# Altium schematic symbol library Analog Devices Operational Amplifiers.SchLib: 2102 symbols (part 25 of 35) (continued)
## ADA4610-2ARMZ (continued)
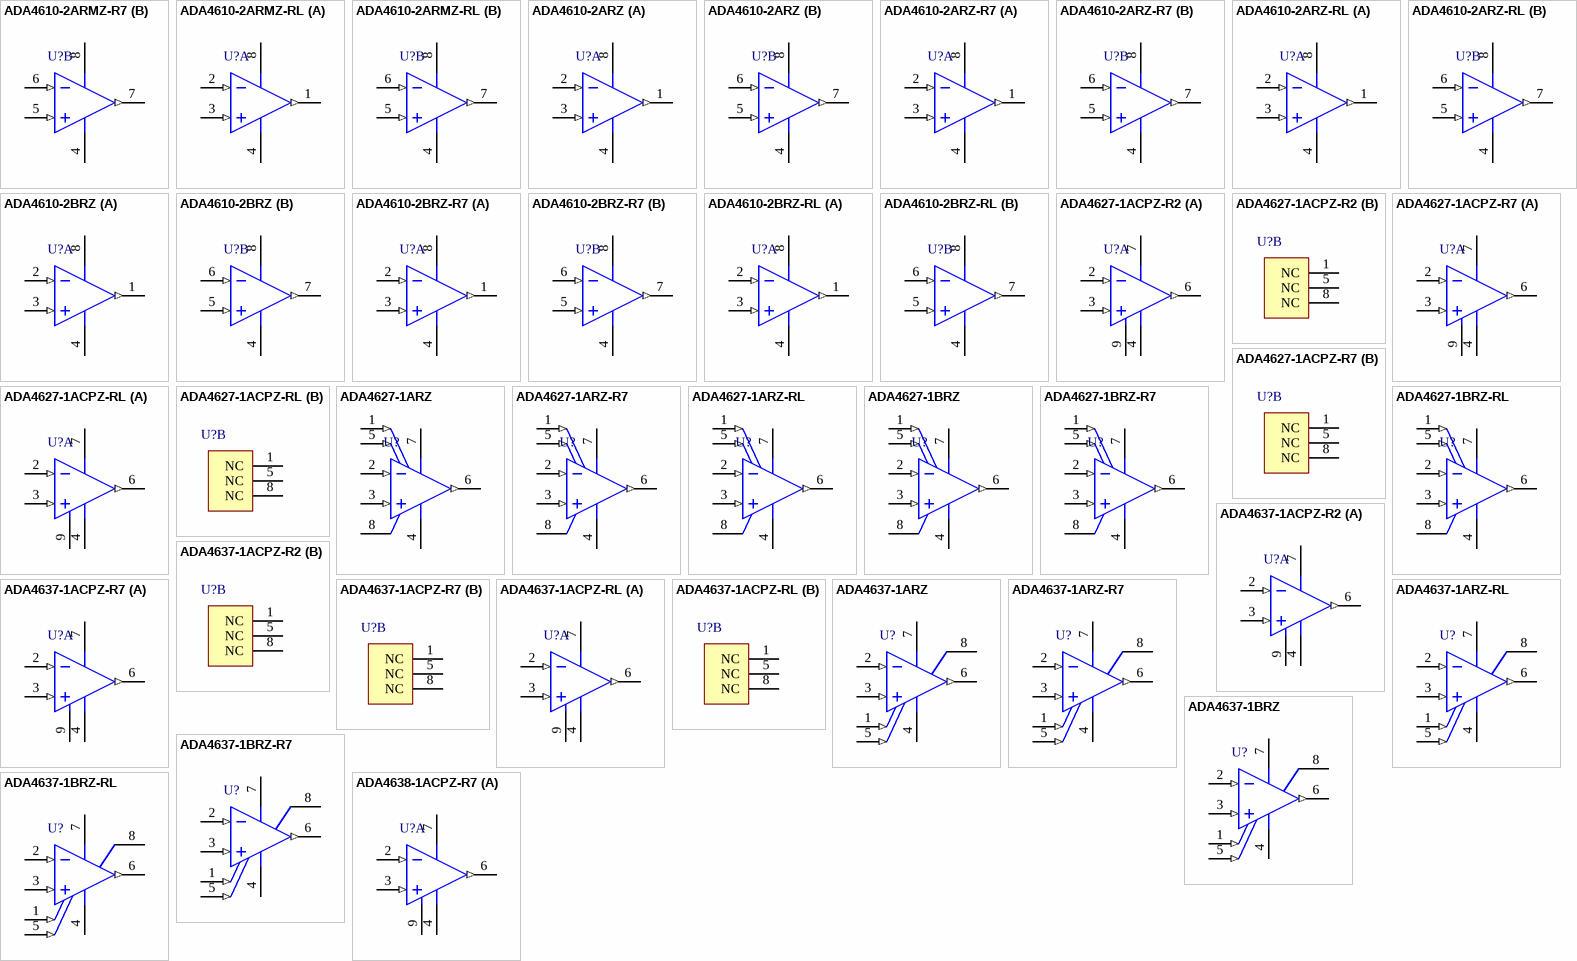
[diagram p80: symbols ADA4610-2ARMZ-R7 to ADA4638-1ACPZ-R7]

## ADA4610-2ARMZ-R7
designator U?
Double Channel Low Offset Voltage Drift Operational Amplifier, 10.6 MHz BW, 25 V/us SR, Industrial, 8-pin SOP (RM-8), Reel; Generic Part Number: ADA4610-2; Manufacturer: Analog Devices; PartNumber: ADA4610-2ARMZ-R7; Amplifiers Per Package: 2; Input Bias Current: 5pA; Input Offset Voltage: 400uV; Iq/Amp: 1.6mA; Slew Rate: 25V/us; V Span Max: 30V; V Span Min: 9V; DatasheetVersion: Rev. B; PackageReference: RM-8; PackageDescription: 8-Pin Mini Small Outline Package, Body 3 x 3 mm, Pitch 0.65 mm; Supplier 1: Digi-Key; Supplier Part Number 1: ADA4610-2ARMZ-R7-ND; Supplier 2: Newark; Supplier Part Number 2: 86T6048; Packing: Reel; Small Signal Bandwidth: 10.6MHz; Mounting Technology: Surface Mount; Code_JEDEC: MO-187-AA; ComponentLink1Description: Manufacturer URL; ComponentLink1URL: http://www.analog.com/en/index.html; ComponentLink2Description: Datasheet; ComponentLink2URL: http://www.analog.com/static/imported-files/data_sheets/ADA4610-2.pdf; ComponentLink3Description: Package Specification; ComponentLink3URL: http://www.analog.com/static/imported-files/packages/PKG_PDF/MSOP%28RM%29/RM_8.pdf
footprint ADI-RM-8_N (SOP, 8-Leads, Body 3x3mm, Pitch 0.65mm, IPC Medium Density)
footprint ADI-RM-8_L (SOP, 8-Leads, Body 3x3mm, Pitch 0.65mm, IPC High Density)
footprint ADI-RM-8_M (SOP, 8-Leads, Body 3x3mm, Pitch 0.65mm, IPC Low Density)
pins on every part: 4 -V (power), 8 +V (power)
part A pins: 1 OUT A (out), 2 -IN A (in), 3 +IN A (in)
part B pins: 5 +IN B (in), 6 -IN B (in), 7 OUT B (out)

## ADA4610-2ARMZ-RL
designator U?
Double Channel Low Offset Voltage Drift Operational Amplifier, 10.6 MHz BW, 25 V/us SR, Industrial, 8-pin SOP (RM-8), Reel; Generic Part Number: ADA4610-2; Manufacturer: Analog Devices; PartNumber: ADA4610-2ARMZ-RL; Amplifiers Per Package: 2; Input Bias Current: 5pA; Input Offset Voltage: 200uV; Iq/Amp: 1.6mA; Slew Rate: 25V/us; V Span Max: 30V; V Span Min: 9V; DatasheetVersion: Rev. B; PackageReference: RM-8; PackageDescription: 8-Pin Mini Small Outline Package, Body 3 x 3 mm, Pitch 0.65 mm; Supplier 1: Digi-Key; Supplier Part Number 1: ADA4610-2ARMZ-RL-ND; Supplier 2: Newark; Supplier Part Number 2: 86T6047; Packing: Reel; Small Signal Bandwidth: 10.6MHz; Mounting Technology: Surface Mount; Code_JEDEC: MO-187-AA; ComponentLink1Description: Manufacturer URL; ComponentLink1URL: http://www.analog.com/en/index.html; ComponentLink2Description: Datasheet; ComponentLink2URL: http://www.analog.com/static/imported-files/data_sheets/ADA4610-2.pdf; ComponentLink3Description: Package Specification; ComponentLink3URL: http://www.analog.com/static/imported-files/packages/PKG_PDF/MSOP%28RM%29/RM_8.pdf
footprint ADI-RM-8_N (SOP, 8-Leads, Body 3x3mm, Pitch 0.65mm, IPC Medium Density)
footprint ADI-RM-8_L (SOP, 8-Leads, Body 3x3mm, Pitch 0.65mm, IPC High Density)
footprint ADI-RM-8_M (SOP, 8-Leads, Body 3x3mm, Pitch 0.65mm, IPC Low Density)
pins on every part: 4 -V (power), 8 +V (power)
part A pins: 1 OUT A (out), 2 -IN A (in), 3 +IN A (in)
part B pins: 5 +IN B (in), 6 -IN B (in), 7 OUT B (out)

## ADA4610-2ARZ
designator U?
Double Channel Low Offset Voltage Drift Operational Amplifier, 10.6 MHz BW, 25 V/us SR, Industrial, 8-pin SOIC (R-8), Tube; Generic Part Number: ADA4610-2; Manufacturer: Analog Devices; PartNumber: ADA4610-2ARZ; Amplifiers Per Package: 2; Input Bias Current: 5pA; Input Offset Voltage: 200uV; Iq/Amp: 1.6mA; Slew Rate: 25V/us; V Span Max: 30V; V Span Min: 9V; DatasheetVersion: Rev. B; PackageVersion: 060506-A; PackageReference: R-8; PackageDescription: 8-Pin Standard Small Outline Package, Body 3.9 x 4.9 mm, Pitch 1.27 mm; Supplier 1: Digi-Key; Supplier Part Number 1: ADA4610-2ARZ-ND; Supplier 2: Farnell; Supplier Part Number 2: 2081046; Supplier 3: Farnell; Supplier Part Number 3: 2127819; Supplier 4: Newark; Supplier Part Number 4: 86T6049; Packing: Tube; Small Signal Bandwidth: 10.6MHz; Mounting Technology: Surface Mount; Code_JEDEC: MS-012-AA; ComponentLink1Description: Manufacturer URL; ComponentLink1URL: http://www.analog.com/en/index.html; ComponentLink2Description: Datasheet; ComponentLink2URL: http://www.analog.com/static/imported-files/data_sheets/ADA4610-2.pdf; ComponentLink3Description: Package Specification; ComponentLink3URL: http://www.analog.com/static/imported-files/packages/PKG_PDF/SOIC_Narrow%20(R)/R_8.pdf
footprint ADI-R-8_N (SOIC, 8-Leads, Body 4.9x3.9mm, Pitch 1.27mm, IPC Medium Density)
footprint ADI-R-8_L (SOIC, 8-Leads, Body 4.9x3.9mm, Pitch 1.27mm, IPC High Density)
footprint ADI-R-8_M (SOIC, 8-Leads, Body 4.9x3.9mm, Pitch 1.27mm, IPC Low Density)
pins on every part: 4 -V (power), 8 +V (power)
part A pins: 1 OUT A (out), 2 -IN A (in), 3 +IN A (in)
part B pins: 5 +IN B (in), 6 -IN B (in), 7 OUT B (out)

## ADA4610-2ARZ-R7
designator U?
Double Channel Low Offset Voltage Drift Operational Amplifier, 10.6 MHz BW, 25 V/us SR, Industrial, 8-pin SOIC (R-8), Reel; Generic Part Number: ADA4610-2; Manufacturer: Analog Devices; PartNumber: ADA4610-2ARZ-R7; Amplifiers Per Package: 2; Input Bias Current: 5pA; Input Offset Voltage: 200uV; Iq/Amp: 1.6mA; Slew Rate: 25V/us; V Span Max: 30V; V Span Min: 9V; DatasheetVersion: Rev. B; PackageVersion: 060506-A; PackageReference: R-8; PackageDescription: 8-Pin Standard Small Outline Package, Body 3.9 x 4.9 mm, Pitch 1.27 mm; Supplier 1: Digi-Key; Supplier Part Number 1: ADA4610-2ARZ-R7-ND; Supplier 2: Newark; Supplier Part Number 2: 86T6051; Packing: Reel; Small Signal Bandwidth: 10.6MHz; Mounting Technology: Surface Mount; Code_JEDEC: MS-012-AA; ComponentLink1Description: Manufacturer URL; ComponentLink1URL: http://www.analog.com/en/index.html; ComponentLink2Description: Datasheet; ComponentLink2URL: http://www.analog.com/static/imported-files/data_sheets/ADA4610-2.pdf; ComponentLink3Description: Package Specification; ComponentLink3URL: http://www.analog.com/static/imported-files/packages/PKG_PDF/SOIC_Narrow%20(R)/R_8.pdf
footprint ADI-R-8_N (SOIC, 8-Leads, Body 4.9x3.9mm, Pitch 1.27mm, IPC Medium Density)
footprint ADI-R-8_L (SOIC, 8-Leads, Body 4.9x3.9mm, Pitch 1.27mm, IPC High Density)
footprint ADI-R-8_M (SOIC, 8-Leads, Body 4.9x3.9mm, Pitch 1.27mm, IPC Low Density)
pins on every part: 4 -V (power), 8 +V (power)
part A pins: 1 OUT A (out), 2 -IN A (in), 3 +IN A (in)
part B pins: 5 +IN B (in), 6 -IN B (in), 7 OUT B (out)

## ADA4610-2ARZ-RL
designator U?
Double Channel Low Offset Voltage Drift Operational Amplifier, 10.6 MHz BW, 25 V/us SR, Industrial, 8-pin SOIC (R-8), Reel; Generic Part Number: ADA4610-2; Manufacturer: Analog Devices; PartNumber: ADA4610-2ARZ-RL; Amplifiers Per Package: 2; Input Bias Current: 5pA; Input Offset Voltage: 200uV; Iq/Amp: 1.6mA; Slew Rate: 25V/us; V Span Max: 30V; V Span Min: 9V; DatasheetVersion: Rev. B; PackageVersion: 060506-A; PackageReference: R-8; PackageDescription: 8-Pin Standard Small Outline Package, Body 3.9 x 4.9 mm, Pitch 1.27 mm; Supplier 1: Digi-Key; Supplier Part Number 1: ADA4610-2ARZ-RL-ND; Supplier 2: Newark; Supplier Part Number 2: 86T6050; Packing: Reel; Small Signal Bandwidth: 10.6MHz; Mounting Technology: Surface Mount; Code_JEDEC: MS-012-AA; ComponentLink1Description: Manufacturer URL; ComponentLink1URL: http://www.analog.com/en/index.html; ComponentLink2Description: Datasheet; ComponentLink2URL: http://www.analog.com/static/imported-files/data_sheets/ADA4610-2.pdf; ComponentLink3Description: Package Specification; ComponentLink3URL: http://www.analog.com/static/imported-files/packages/PKG_PDF/SOIC_Narrow%20(R)/R_8.pdf
footprint ADI-R-8_N (SOIC, 8-Leads, Body 4.9x3.9mm, Pitch 1.27mm, IPC Medium Density)
footprint ADI-R-8_L (SOIC, 8-Leads, Body 4.9x3.9mm, Pitch 1.27mm, IPC High Density)
footprint ADI-R-8_M (SOIC, 8-Leads, Body 4.9x3.9mm, Pitch 1.27mm, IPC Low Density)
pins on every part: 4 -V (power), 8 +V (power)
part A pins: 1 OUT A (out), 2 -IN A (in), 3 +IN A (in)
part B pins: 5 +IN B (in), 6 -IN B (in), 7 OUT B (out)

## ADA4610-2BRZ
designator U?
Double Channel Low Offset Voltage Drift Operational Amplifier, 10.6 MHz BW, 25 V/us SR, Industrial, 8-pin SOIC (R-8), Tube; Generic Part Number: ADA4610-2; Manufacturer: Analog Devices; PartNumber: ADA4610-2BRZ; Amplifiers Per Package: 2; Input Bias Current: 5pA; Input Offset Voltage: 200uV; Iq/Amp: 1.6mA; Slew Rate: 25V/us; V Span Max: 30V; V Span Min: 9V; DatasheetVersion: Rev. B; PackageVersion: 060506-A; PackageReference: R-8; PackageDescription: 8-Pin Standard Small Outline Package, Body 3.9 x 4.9 mm, Pitch 1.27 mm; Supplier 1: Digi-Key; Supplier Part Number 1: ADA4610-2BRZ-ND; Supplier 2: Farnell; Supplier Part Number 2: 2081047; Supplier 3: Newark; Supplier Part Number 3: 86T6052; Packing: Tube; Small Signal Bandwidth: 10.6MHz; Mounting Technology: Surface Mount; Code_JEDEC: MS-012-AA; ComponentLink1Description: Manufacturer URL; ComponentLink1URL: http://www.analog.com/en/index.html; ComponentLink2Description: Datasheet; ComponentLink2URL: http://www.analog.com/static/imported-files/data_sheets/ADA4610-2.pdf; ComponentLink3Description: Package Specification; ComponentLink3URL: http://www.analog.com/static/imported-files/packages/PKG_PDF/SOIC_Narrow%20(R)/R_8.pdf
footprint ADI-R-8_N (SOIC, 8-Leads, Body 4.9x3.9mm, Pitch 1.27mm, IPC Medium Density)
footprint ADI-R-8_L (SOIC, 8-Leads, Body 4.9x3.9mm, Pitch 1.27mm, IPC High Density)
footprint ADI-R-8_M (SOIC, 8-Leads, Body 4.9x3.9mm, Pitch 1.27mm, IPC Low Density)
pins on every part: 4 -V (power), 8 +V (power)
part A pins: 1 OUT A (out), 2 -IN A (in), 3 +IN A (in)
part B pins: 5 +IN B (in), 6 -IN B (in), 7 OUT B (out)

## ADA4610-2BRZ-R7
designator U?
Double Channel Low Offset Voltage Drift Operational Amplifier, 10.6 MHz BW, 25 V/us SR, Industrial, 8-pin SOIC (R-8), Reel; Generic Part Number: ADA4610-2; Manufacturer: Analog Devices; PartNumber: ADA4610-2BRZ-R7; Amplifiers Per Package: 2; Input Bias Current: 5pA; Input Offset Voltage: 200uV; Iq/Amp: 1.6mA; Slew Rate: 25V/us; V Span Max: 30V; V Span Min: 9V; DatasheetVersion: Rev. B; PackageVersion: 060506-A; PackageReference: R-8; PackageDescription: 8-Pin Standard Small Outline Package, Body 3.9 x 4.9 mm, Pitch 1.27 mm; Supplier 1: Digi-Key; Supplier Part Number 1: ADA4610-2BRZ-R7-ND; Supplier 2: Newark; Supplier Part Number 2: 86T6054; Packing: Reel; Small Signal Bandwidth: 10.6MHz; Mounting Technology: Surface Mount; Code_JEDEC: MS-012-AA; ComponentLink1Description: Manufacturer URL; ComponentLink1URL: http://www.analog.com/en/index.html; ComponentLink2Description: Datasheet; ComponentLink2URL: http://www.analog.com/static/imported-files/data_sheets/ADA4610-2.pdf; ComponentLink3Description: Package Specification; ComponentLink3URL: http://www.analog.com/static/imported-files/packages/PKG_PDF/SOIC_Narrow%20(R)/R_8.pdf
footprint ADI-R-8_N (SOIC, 8-Leads, Body 4.9x3.9mm, Pitch 1.27mm, IPC Medium Density)
footprint ADI-R-8_L (SOIC, 8-Leads, Body 4.9x3.9mm, Pitch 1.27mm, IPC High Density)
footprint ADI-R-8_M (SOIC, 8-Leads, Body 4.9x3.9mm, Pitch 1.27mm, IPC Low Density)
pins on every part: 4 -V (power), 8 +V (power)
part A pins: 1 OUT A (out), 2 -IN A (in), 3 +IN A (in)
part B pins: 5 +IN B (in), 6 -IN B (in), 7 OUT B (out)

## ADA4610-2BRZ-RL
designator U?
Double Channel Low Offset Voltage Drift Operational Amplifier, 10.6 MHz BW, 25 V/us SR, Industrial, 8-pin SOIC (R-8), Reel; Generic Part Number: ADA4610-2; Manufacturer: Analog Devices; PartNumber: ADA4610-2BRZ-RL; Amplifiers Per Package: 2; Input Bias Current: 5pA; Input Offset Voltage: 200uV; Iq/Amp: 1.6mA; Slew Rate: 25V/us; V Span Max: 30V; V Span Min: 9V; DatasheetVersion: Rev. B; PackageVersion: 060506-A; PackageReference: R-8; PackageDescription: 8-Pin Standard Small Outline Package, Body 3.9 x 4.9 mm, Pitch 1.27 mm; Supplier 1: Digi-Key; Supplier Part Number 1: ADA4610-2BRZ-RL-ND; Supplier 2: Newark; Supplier Part Number 2: 86T6053; Packing: Reel; Small Signal Bandwidth: 10.6MHz; Mounting Technology: Surface Mount; Code_JEDEC: MS-012-AA; ComponentLink1Description: Manufacturer URL; ComponentLink1URL: http://www.analog.com/en/index.html; ComponentLink2Description: Datasheet; ComponentLink2URL: http://www.analog.com/static/imported-files/data_sheets/ADA4610-2.pdf; ComponentLink3Description: Package Specification; ComponentLink3URL: http://www.analog.com/static/imported-files/packages/PKG_PDF/SOIC_Narrow%20(R)/R_8.pdf
footprint ADI-R-8_N (SOIC, 8-Leads, Body 4.9x3.9mm, Pitch 1.27mm, IPC Medium Density)
footprint ADI-R-8_L (SOIC, 8-Leads, Body 4.9x3.9mm, Pitch 1.27mm, IPC High Density)
footprint ADI-R-8_M (SOIC, 8-Leads, Body 4.9x3.9mm, Pitch 1.27mm, IPC Low Density)
pins on every part: 4 -V (power), 8 +V (power)
part A pins: 1 OUT A (out), 2 -IN A (in), 3 +IN A (in)
part B pins: 5 +IN B (in), 6 -IN B (in), 7 OUT B (out)

## ADA4627-1ACPZ-R2
designator U?
Single Channel Low Offset Voltage Operational Amplifier, 19 MHz BW, 40 V/us SR, Industrial, 8-pin QFN (CP-8-2), Reel; Generic Part Number: ADA4627-1; Manufacturer: Analog Devices; PartNumber: ADA4627-1ACPZ-R2; Amplifiers Per Package: 1; Input Bias Current: 1pA; Input Offset Voltage: 70uV; Iq/Amp: 7mA; Slew Rate: 40V/us; Small Signal Bandwidth: 19MHz; V Span Max: 30V; V Span Min: 10V; DatasheetVersion: Rev. D; PackageVersion: 061507-B; PackageReference: CP-8-2; PackageDescription: 8-Pin Lead Frame Chip Scale Package, Body 3 x 3 mm, Pitch 0.5 mm; Supplier 1: Digi-Key; Supplier Part Number 1: ADA4627-1ACPZ-R2TR-ND; Supplier 2: Digi-Key; Supplier Part Number 2: ADA4627-1ACPZ-R2CT-ND; Supplier 3: Digi-Key; Supplier Part Number 3: ADA4627-1ACPZ-R2DKR-ND; Supplier 4: Farnell; Supplier Part Number 4: 1827379; Supplier 5: Newark; Supplier Part Number 5: 26R2396; Mounting Technology: Surface Mount; ComponentLink1Description: Manufacturer URL; ComponentLink1URL: http://www.analog.com/en/index.html; ComponentLink2Description: Datasheet; ComponentLink2URL: http://www.analog.com/static/imported-files/data_sheets/ADA4627-1_4637-1.pdf; ComponentLink3Description: Package Specification; ComponentLink3URL: http://www.analog.com/static/imported-files/packages/56953322593982CP_8_2.pdf; ComponentLink4Description: Reference Circuit; ComponentLink4URL: http://www.analog.com/en/all-operational-amplifiers-op-amps/operational-amplifiers-op-amps/ada4627-1/products/product.html#product-recommendations
footprint ADI-CP-8-2_N (QFN, 8-Leads, Body 3x3mm, Pitch 0.5mm, Thermal Pad 1.45X1.74mm, IPC Medium Density)
footprint ADI-CP-8-2_L (QFN, 8-Leads, Body 3x3mm, Pitch 0.5mm, Thermal Pad 1.45X1.74mm, IPC High Density)
footprint ADI-CP-8-2_M (QFN, 8-Leads, Body 3x3mm, Pitch 0.5mm, Thermal Pad 1.45X1.74mm, IPC Low Density)
part A pins: 2 -IN (in), 3 +IN (in), 4 -V (power), 6 OUT (out), 7 +V (power), 9 EP (power)
part B pins: 1 NC, 5 NC, 8 NC

## ADA4627-1ACPZ-R7
designator U?
Single Channel Low Offset Voltage Operational Amplifier, 19 MHz BW, 40 V/us SR, Industrial, 8-pin QFN (CP-8-2), Reel; Generic Part Number: ADA4627-1; Manufacturer: Analog Devices; PartNumber: ADA4627-1ACPZ-R7; Amplifiers Per Package: 1; Input Bias Current: 1pA; Input Offset Voltage: 70uV; Iq/Amp: 7mA; Slew Rate: 40V/us; Small Signal Bandwidth: 19MHz; V Span Max: 30V; V Span Min: 10V; DatasheetVersion: Rev. D; PackageVersion: 061507-B; PackageReference: CP-8-2; PackageDescription: 8-Pin Lead Frame Chip Scale Package, Body 3 x 3 mm, Pitch 0.5 mm; Supplier 1: Digi-Key; Supplier Part Number 1: ADA4627-1ACPZ-R7-ND; Supplier 2: Newark; Supplier Part Number 2: 26R2397; Mounting Technology: Surface Mount; ComponentLink1Description: Manufacturer URL; ComponentLink1URL: http://www.analog.com/en/index.html; ComponentLink2Description: Datasheet; ComponentLink2URL: http://www.analog.com/static/imported-files/data_sheets/ADA4627-1_4637-1.pdf; ComponentLink3Description: Package Specification; ComponentLink3URL: http://www.analog.com/static/imported-files/packages/56953322593982CP_8_2.pdf; ComponentLink4Description: Reference Circuit; ComponentLink4URL: http://www.analog.com/en/all-operational-amplifiers-op-amps/operational-amplifiers-op-amps/ada4627-1/products/product.html#product-recommendations
footprint ADI-CP-8-2_N (QFN, 8-Leads, Body 3x3mm, Pitch 0.5mm, Thermal Pad 1.45X1.74mm, IPC Medium Density)
footprint ADI-CP-8-2_L (QFN, 8-Leads, Body 3x3mm, Pitch 0.5mm, Thermal Pad 1.45X1.74mm, IPC High Density)
footprint ADI-CP-8-2_M (QFN, 8-Leads, Body 3x3mm, Pitch 0.5mm, Thermal Pad 1.45X1.74mm, IPC Low Density)
part A pins: 2 -IN (in), 3 +IN (in), 4 -V (power), 6 OUT (out), 7 +V (power), 9 EP (power)
part B pins: 1 NC, 5 NC, 8 NC

## ADA4627-1ACPZ-RL
designator U?
Single Channel Low Offset Voltage Operational Amplifier, 19 MHz BW, 40 V/us SR, Industrial, 8-pin QFN (CP-8-2), Reel; Generic Part Number: ADA4627-1; Manufacturer: Analog Devices; PartNumber: ADA4627-1ACPZ-RL; Amplifiers Per Package: 1; Input Bias Current: 1pA; Input Offset Voltage: 70uV; Iq/Amp: 7mA; Slew Rate: 40V/us; Small Signal Bandwidth: 19MHz; V Span Max: 30V; V Span Min: 10V; DatasheetVersion: Rev. D; PackageVersion: 061507-B; PackageReference: CP-8-2; PackageDescription: 8-Pin Lead Frame Chip Scale Package, Body 3 x 3 mm, Pitch 0.5 mm; Supplier 1: Digi-Key; Supplier Part Number 1: ADA4627-1ACPZ-RL-ND; Mounting Technology: Surface Mount; ComponentLink1Description: Manufacturer URL; ComponentLink1URL: http://www.analog.com/en/index.html; ComponentLink2Description: Datasheet; ComponentLink2URL: http://www.analog.com/static/imported-files/data_sheets/ADA4627-1_4637-1.pdf; ComponentLink3Description: Package Specification; ComponentLink3URL: http://www.analog.com/static/imported-files/packages/56953322593982CP_8_2.pdf; ComponentLink4Description: Reference Circuit; ComponentLink4URL: http://www.analog.com/en/all-operational-amplifiers-op-amps/operational-amplifiers-op-amps/ada4627-1/products/product.html#product-recommendations
footprint ADI-CP-8-2_N (QFN, 8-Leads, Body 3x3mm, Pitch 0.5mm, Thermal Pad 1.45X1.74mm, IPC Medium Density)
footprint ADI-CP-8-2_L (QFN, 8-Leads, Body 3x3mm, Pitch 0.5mm, Thermal Pad 1.45X1.74mm, IPC High Density)
footprint ADI-CP-8-2_M (QFN, 8-Leads, Body 3x3mm, Pitch 0.5mm, Thermal Pad 1.45X1.74mm, IPC Low Density)
part A pins: 2 -IN (in), 3 +IN (in), 4 -V (power), 6 OUT (out), 7 +V (power), 9 EP (power)
part B pins: 1 NC, 5 NC, 8 NC

## ADA4627-1ARZ
designator U?
Single Channel Low Offset Voltage Operational Amplifier, 19 MHz BW, 40 V/us SR, Industrial, 8-pin SOIC (R-8), Tube; Generic Part Number: ADA4627-1; Manufacturer: Analog Devices; PartNumber: ADA4627-1ARZ; Amplifiers Per Package: 1; Input Bias Current: 1pA; Input Offset Voltage: 70uV; Iq/Amp: 7mA; Slew Rate: 40V/us; Small Signal Bandwidth: 19MHz; V Span Max: 30V; V Span Min: 10V; DatasheetVersion: Rev. D; PackageVersion: 060506-A; PackageReference: R-8; PackageDescription: 8-Pin Standard Small Outline Package, Body 3.9 x 4.9 mm, Pitch 1.27 mm; Supplier 1: Digi-Key; Supplier Part Number 1: ADA4627-1ARZ-ND; Supplier 2: Farnell; Supplier Part Number 2: 1827378; Supplier 3: Newark; Supplier Part Number 3: 26R2398; Mounting Technology: Surface Mount; Code_JEDEC: MS-012-AA; ComponentLink1Description: Manufacturer URL; ComponentLink1URL: http://www.analog.com/en/index.html; ComponentLink2Description: Datasheet; ComponentLink2URL: http://www.analog.com/static/imported-files/data_sheets/ADA4627-1_4637-1.pdf; ComponentLink3Description: Package Specification; ComponentLink3URL: http://www.analog.com/static/imported-files/packages/PKG_PDF/SOIC_Narrow%20(R)/R_8.pdf; ComponentLink4Description: Reference Circuit; ComponentLink4URL: http://www.analog.com/en/all-operational-amplifiers-op-amps/operational-amplifiers-op-amps/ada4627-1/products/product.html#product-recommendations
footprint ADI-R-8_N (SOIC, 8-Leads, Body 4.9x3.9mm, Pitch 1.27mm, IPC Medium Density)
footprint ADI-R-8_L (SOIC, 8-Leads, Body 4.9x3.9mm, Pitch 1.27mm, IPC High Density)
footprint ADI-R-8_M (SOIC, 8-Leads, Body 4.9x3.9mm, Pitch 1.27mm, IPC Low Density)
pins: 1 NULL (in), 2 -IN (in), 3 +IN (in), 4 -V (power), 5 NULL (in), 6 OUT (out), 7 +V (power), 8 NC

## ADA4627-1ARZ-R7
designator U?
Single Channel Low Offset Voltage Operational Amplifier, 19 MHz BW, 40 V/us SR, Industrial, 8-pin SOIC (R-8), Reel; Generic Part Number: ADA4627-1; Manufacturer: Analog Devices; PartNumber: ADA4627-1ARZ-R7; Amplifiers Per Package: 1; Input Bias Current: 1pA; Input Offset Voltage: 70uV; Iq/Amp: 7mA; Slew Rate: 40V/us; Small Signal Bandwidth: 19MHz; V Span Max: 30V; V Span Min: 10V; DatasheetVersion: Rev. D; PackageVersion: 060506-A; PackageReference: R-8; PackageDescription: 8-Pin Standard Small Outline Package, Body 3.9 x 4.9 mm, Pitch 1.27 mm; Supplier 1: Digi-Key; Supplier Part Number 1: ADA4627-1ARZ-R7TR-ND; Supplier 2: Digi-Key; Supplier Part Number 2: ADA4627-1ARZ-R7CT-ND; Supplier 3: Digi-Key; Supplier Part Number 3: ADA4627-1ARZ-R7DKR-ND; Supplier 4: Newark; Supplier Part Number 4: 26R2400; Mounting Technology: Surface Mount; Code_JEDEC: MS-012-AA; ComponentLink1Description: Manufacturer URL; ComponentLink1URL: http://www.analog.com/en/index.html; ComponentLink2Description: Datasheet; ComponentLink2URL: http://www.analog.com/static/imported-files/data_sheets/ADA4627-1_4637-1.pdf; ComponentLink3Description: Package Specification; ComponentLink3URL: http://www.analog.com/static/imported-files/packages/PKG_PDF/SOIC_Narrow%20(R)/R_8.pdf; ComponentLink4Description: Reference Circuit; ComponentLink4URL: http://www.analog.com/en/all-operational-amplifiers-op-amps/operational-amplifiers-op-amps/ada4627-1/products/product.html#product-recommendations
footprint ADI-R-8_N (SOIC, 8-Leads, Body 4.9x3.9mm, Pitch 1.27mm, IPC Medium Density)
footprint ADI-R-8_L (SOIC, 8-Leads, Body 4.9x3.9mm, Pitch 1.27mm, IPC High Density)
footprint ADI-R-8_M (SOIC, 8-Leads, Body 4.9x3.9mm, Pitch 1.27mm, IPC Low Density)
pins: 1 NULL (in), 2 -IN (in), 3 +IN (in), 4 -V (power), 5 NULL (in), 6 OUT (out), 7 +V (power), 8 NC

## ADA4627-1ARZ-RL
designator U?
Single Channel Low Offset Voltage Operational Amplifier, 19 MHz BW, 40 V/us SR, Industrial, 8-pin SOIC (R-8), Reel; Generic Part Number: ADA4627-1; Manufacturer: Analog Devices; PartNumber: ADA4627-1ARZ-RL; Amplifiers Per Package: 1; Input Bias Current: 1pA; Input Offset Voltage: 70uV; Iq/Amp: 7mA; Slew Rate: 40V/us; Small Signal Bandwidth: 19MHz; V Span Max: 30V; V Span Min: 10V; DatasheetVersion: Rev. D; PackageVersion: 060506-A; PackageReference: R-8; PackageDescription: 8-Pin Standard Small Outline Package, Body 3.9 x 4.9 mm, Pitch 1.27 mm; Supplier 1: Digi-Key; Supplier Part Number 1: ADA4627-1ARZ-RL-ND; Supplier 2: Newark; Supplier Part Number 2: 26R2399; Mounting Technology: Surface Mount; Code_JEDEC: MS-012-AA; ComponentLink1Description: Manufacturer URL; ComponentLink1URL: http://www.analog.com/en/index.html; ComponentLink2Description: Datasheet; ComponentLink2URL: http://www.analog.com/static/imported-files/data_sheets/ADA4627-1_4637-1.pdf; ComponentLink3Description: Package Specification; ComponentLink3URL: http://www.analog.com/static/imported-files/packages/PKG_PDF/SOIC_Narrow%20(R)/R_8.pdf; ComponentLink4Description: Reference Circuit; ComponentLink4URL: http://www.analog.com/en/all-operational-amplifiers-op-amps/operational-amplifiers-op-amps/ada4627-1/products/product.html#product-recommendations
footprint ADI-R-8_N (SOIC, 8-Leads, Body 4.9x3.9mm, Pitch 1.27mm, IPC Medium Density)
footprint ADI-R-8_L (SOIC, 8-Leads, Body 4.9x3.9mm, Pitch 1.27mm, IPC High Density)
footprint ADI-R-8_M (SOIC, 8-Leads, Body 4.9x3.9mm, Pitch 1.27mm, IPC Low Density)
pins: 1 NULL (in), 2 -IN (in), 3 +IN (in), 4 -V (power), 5 NULL (in), 6 OUT (out), 7 +V (power), 8 NC

## ADA4627-1BRZ
designator U?
Single Channel Low Offset Voltage Operational Amplifier, 19 MHz BW, 40 V/us SR, Industrial, 8-pin SOIC (R-8), Tube; Generic Part Number: ADA4627-1; Manufacturer: Analog Devices; PartNumber: ADA4627-1BRZ; Amplifiers Per Package: 1; Input Bias Current: 1pA; Input Offset Voltage: 70uV; Iq/Amp: 7mA; Slew Rate: 40V/us; Small Signal Bandwidth: 19MHz; V Span Max: 30V; V Span Min: 10V; DatasheetVersion: Rev. D; PackageVersion: 060506-A; PackageReference: R-8; PackageDescription: 8-Pin Standard Small Outline Package, Body 3.9 x 4.9 mm, Pitch 1.27 mm; Supplier 1: Digi-Key; Supplier Part Number 1: ADA4627-1BRZ-ND; Supplier 2: Farnell; Supplier Part Number 2: 2067785; Supplier 3: Newark; Supplier Part Number 3: 73T8137; Supplier 4: Newark; Supplier Part Number 4: 26R2401; Mounting Technology: Surface Mount; Code_JEDEC: MS-012-AA; ComponentLink1Description: Manufacturer URL; ComponentLink1URL: http://www.analog.com/en/index.html; ComponentLink2Description: Datasheet; ComponentLink2URL: http://www.analog.com/static/imported-files/data_sheets/ADA4627-1_4637-1.pdf; ComponentLink3Description: Package Specification; ComponentLink3URL: http://www.analog.com/static/imported-files/packages/PKG_PDF/SOIC_Narrow%20(R)/R_8.pdf; ComponentLink4Description: Reference Circuit; ComponentLink4URL: http://www.analog.com/en/all-operational-amplifiers-op-amps/operational-amplifiers-op-amps/ada4627-1/products/product.html#product-recommendations
footprint ADI-R-8_N (SOIC, 8-Leads, Body 4.9x3.9mm, Pitch 1.27mm, IPC Medium Density)
footprint ADI-R-8_L (SOIC, 8-Leads, Body 4.9x3.9mm, Pitch 1.27mm, IPC High Density)
footprint ADI-R-8_M (SOIC, 8-Leads, Body 4.9x3.9mm, Pitch 1.27mm, IPC Low Density)
pins: 1 NULL (in), 2 -IN (in), 3 +IN (in), 4 -V (power), 5 NULL (in), 6 OUT (out), 7 +V (power), 8 NC

## ADA4627-1BRZ-R7
designator U?
Single Channel Low Offset Voltage Operational Amplifier, 19 MHz BW, 40 V/us SR, Industrial, 8-pin SOIC (R-8), Reel; Generic Part Number: ADA4627-1; Manufacturer: Analog Devices; PartNumber: ADA4627-1BRZ-R7; Amplifiers Per Package: 1; Input Bias Current: 1pA; Input Offset Voltage: 70uV; Iq/Amp: 7mA; Slew Rate: 40V/us; Small Signal Bandwidth: 19MHz; V Span Max: 30V; V Span Min: 10V; DatasheetVersion: Rev. D; PackageVersion: 060506-A; PackageReference: R-8; PackageDescription: 8-Pin Standard Small Outline Package, Body 3.9 x 4.9 mm, Pitch 1.27 mm; Supplier 1: Digi-Key; Supplier Part Number 1: ADA4627-1BRZ-R7-ND; Supplier 2: Newark; Supplier Part Number 2: 26R2403; Mounting Technology: Surface Mount; Code_JEDEC: MS-012-AA; ComponentLink1Description: Manufacturer URL; ComponentLink1URL: http://www.analog.com/en/index.html; ComponentLink2Description: Datasheet; ComponentLink2URL: http://www.analog.com/static/imported-files/data_sheets/ADA4627-1_4637-1.pdf; ComponentLink3Description: Package Specification; ComponentLink3URL: http://www.analog.com/static/imported-files/packages/PKG_PDF/SOIC_Narrow%20(R)/R_8.pdf; ComponentLink4Description: Reference Circuit; ComponentLink4URL: http://www.analog.com/en/all-operational-amplifiers-op-amps/operational-amplifiers-op-amps/ada4627-1/products/product.html#product-recommendations
footprint ADI-R-8_N (SOIC, 8-Leads, Body 4.9x3.9mm, Pitch 1.27mm, IPC Medium Density)
footprint ADI-R-8_L (SOIC, 8-Leads, Body 4.9x3.9mm, Pitch 1.27mm, IPC High Density)
footprint ADI-R-8_M (SOIC, 8-Leads, Body 4.9x3.9mm, Pitch 1.27mm, IPC Low Density)
pins: 1 NULL (in), 2 -IN (in), 3 +IN (in), 4 -V (power), 5 NULL (in), 6 OUT (out), 7 +V (power), 8 NC

## ADA4627-1BRZ-RL
designator U?
Single Channel Low Offset Voltage Operational Amplifier, 19 MHz BW, 40 V/us SR, Industrial, 8-pin SOIC (R-8), Reel; Generic Part Number: ADA4627-1; Manufacturer: Analog Devices; PartNumber: ADA4627-1BRZ-RL; Amplifiers Per Package: 1; Input Bias Current: 1pA; Input Offset Voltage: 70uV; Iq/Amp: 7mA; Slew Rate: 40V/us; Small Signal Bandwidth: 19MHz; V Span Max: 30V; V Span Min: 10V; DatasheetVersion: Rev. D; PackageVersion: 060506-A; PackageReference: R-8; PackageDescription: 8-Pin Standard Small Outline Package, Body 3.9 x 4.9 mm, Pitch 1.27 mm; Supplier 1: Digi-Key; Supplier Part Number 1: ADA4627-1BRZ-RL-ND; Supplier 2: Newark; Supplier Part Number 2: 26R2402; Mounting Technology: Surface Mount; Code_JEDEC: MS-012-AA; ComponentLink1Description: Manufacturer URL; ComponentLink1URL: http://www.analog.com/en/index.html; ComponentLink2Description: Datasheet; ComponentLink2URL: http://www.analog.com/static/imported-files/data_sheets/ADA4627-1_4637-1.pdf; ComponentLink3Description: Package Specification; ComponentLink3URL: http://www.analog.com/static/imported-files/packages/PKG_PDF/SOIC_Narrow%20(R)/R_8.pdf; ComponentLink4Description: Reference Circuit; ComponentLink4URL: http://www.analog.com/en/all-operational-amplifiers-op-amps/operational-amplifiers-op-amps/ada4627-1/products/product.html#product-recommendations
footprint ADI-R-8_N (SOIC, 8-Leads, Body 4.9x3.9mm, Pitch 1.27mm, IPC Medium Density)
footprint ADI-R-8_L (SOIC, 8-Leads, Body 4.9x3.9mm, Pitch 1.27mm, IPC High Density)
footprint ADI-R-8_M (SOIC, 8-Leads, Body 4.9x3.9mm, Pitch 1.27mm, IPC Low Density)
pins: 1 NULL (in), 2 -IN (in), 3 +IN (in), 4 -V (power), 5 NULL (in), 6 OUT (out), 7 +V (power), 8 NC